# Altium footprint library PcbLib_ICs.PcbLib: 317 footprints (part 6 of 24)
Each footprint in its own frame and in the unit in brackets; x right, y up, seen from the top. Pads: shape width x height; smd on the part's side, far side on the other; paste and mask are expansions set on the pad; w line width, h text height; cw(c..) or ccw(c..) is an arc to the next point about the centre after c.
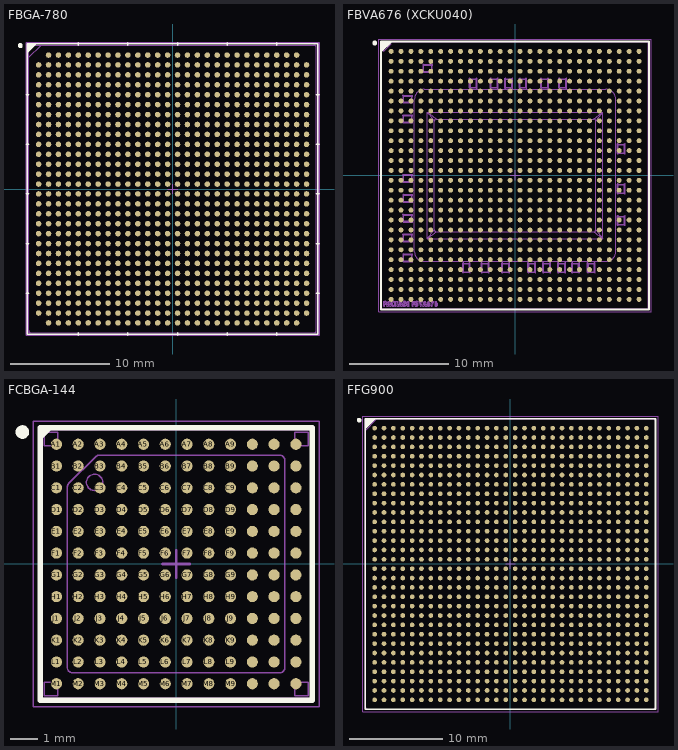
[diagram p5: the footprints below, top view; thin cyan lines are the x and y axes]

## FBGA-780 [mil] "BGA, 780-Balls, Body 29x29mm, Pitch 1mm"
pads (780):
  round 22 smd paste+0 mask+1.97: A2(-492.13,531.5) A3(-452.76,531.5) A4(-413.39,531.5) A5(-374.02,531.5) A6(-334.65,531.5) A7(-295.28,531.5) A8(-255.91,531.5) A9(-216.54,531.5) A10(-177.17,531.5) A11(-137.8,531.5) A12(-98.43,531.5) A13(-59.06,531.5) A14(-19.68,531.5) A15(19.68,531.5) A16(59.06,531.5) A17(98.43,531.5) A18(137.8,531.5) A19(177.17,531.5) A20(216.54,531.5) A21(255.91,531.5) A22(295.28,531.5) A23(334.65,531.5) A24(374.02,531.5) A25(413.39,531.5) A26(452.76,531.5) A27(492.13,531.5) AA1(-531.5,-255.91) AA2(-492.13,-255.91) AA3(-452.76,-255.91) AA4(-413.39,-255.91) AA5(-374.02,-255.91) AA6(-334.65,-255.91) AA7(-295.28,-255.91) AA8(-255.91,-255.91) AA9(-216.54,-255.91) AA10(-177.17,-255.91) AA11(-137.8,-255.91) AA12(-98.43,-255.91) AA13(-59.06,-255.91) AA14(-19.68,-255.91) AA15(19.68,-255.91) AA16(59.06,-255.91) AA17(98.43,-255.91) AA18(137.8,-255.91) AA19(177.17,-255.91) AA20(216.54,-255.91) AA21(255.91,-255.91) AA22(295.28,-255.91) AA23(334.65,-255.91) AA24(374.02,-255.91) AA25(413.39,-255.91) AA26(452.76,-255.91) AA27(492.13,-255.91) AA28(531.5,-255.91) AB1(-531.5,-295.27) AB2(-492.13,-295.27) AB3(-452.76,-295.27) AB4(-413.39,-295.27) AB5(-374.02,-295.27) AB6(-334.65,-295.27) AB7(-295.28,-295.27) AB8(-255.91,-295.27) AB9(-216.54,-295.27) AB10(-177.17,-295.27) AB11(-137.8,-295.27) AB12(-98.43,-295.27) AB13(-59.06,-295.27) AB14(-19.68,-295.27) AB15(19.68,-295.27) AB16(59.06,-295.27) AB17(98.43,-295.27) AB18(137.8,-295.27) AB19(177.17,-295.27) AB20(216.54,-295.27) AB21(255.91,-295.27) AB22(295.28,-295.27) AB23(334.65,-295.27) AB24(374.02,-295.27) AB25(413.39,-295.27) AB26(452.76,-295.27) AB27(492.13,-295.27) AB28(531.5,-295.27) AC1(-531.5,-334.64) AC2(-492.13,-334.64) AC3(-452.76,-334.64) AC4(-413.39,-334.64) AC5(-374.02,-334.64) AC6(-334.65,-334.64) AC7(-295.28,-334.64) AC8(-255.91,-334.64) AC9(-216.54,-334.64) AC10(-177.17,-334.64) AC11(-137.8,-334.64) AC12(-98.43,-334.64) AC13(-59.06,-334.64) AC14(-19.68,-334.64) AC15(19.68,-334.64) AC16(59.06,-334.64) AC17(98.43,-334.64) AC18(137.8,-334.64) AC19(177.17,-334.64) AC20(216.54,-334.64) AC21(255.91,-334.64) AC22(295.28,-334.64) AC23(334.65,-334.64) AC24(374.02,-334.64) AC25(413.39,-334.64) AC26(452.76,-334.64) AC27(492.13,-334.64) AC28(531.5,-334.64) AD1(-531.5,-374.01) AD2(-492.13,-374.01) AD3(-452.76,-374.01) AD4(-413.39,-374.01) AD5(-374.02,-374.01) AD6(-334.65,-374.01) AD7(-295.28,-374.01) AD8(-255.91,-374.01) AD9(-216.54,-374.01) AD10(-177.17,-374.01) AD11(-137.8,-374.01) AD12(-98.43,-374.01) AD13(-59.06,-374.01) AD14(-19.68,-374.01) AD15(19.68,-374.01) AD16(59.06,-374.01) AD17(98.43,-374.01) AD18(137.8,-374.01) AD19(177.17,-374.01) AD20(216.54,-374.01) AD21(255.91,-374.01) AD22(295.28,-374.01) AD23(334.65,-374.01) AD24(374.02,-374.01) AD25(413.39,-374.01) AD26(452.76,-374.01) AD27(492.13,-374.01) AD28(531.5,-374.01) AE1(-531.5,-413.38) AE2(-492.13,-413.38) AE3(-452.76,-413.38) AE4(-413.39,-413.38) AE5(-374.02,-413.38) AE6(-334.65,-413.38) AE7(-295.28,-413.38) AE8(-255.91,-413.38) AE9(-216.54,-413.38) AE10(-177.17,-413.38) AE11(-137.8,-413.38) AE12(-98.43,-413.38) AE13(-59.06,-413.38) AE14(-19.68,-413.38) AE15(19.68,-413.38) AE16(59.06,-413.38) AE17(98.43,-413.38) AE18(137.8,-413.38) AE19(177.17,-413.38) AE20(216.54,-413.38) AE21(255.91,-413.38) AE22(295.28,-413.38) AE23(334.65,-413.38) AE24(374.02,-413.38) AE25(413.39,-413.38) AE26(452.76,-413.38) AE27(492.13,-413.38) AE28(531.5,-413.38) AF1(-531.5,-452.75) AF2(-492.13,-452.75) AF3(-452.76,-452.75) AF4(-413.39,-452.75) AF5(-374.02,-452.75) AF6(-334.65,-452.75) AF7(-295.28,-452.75) AF8(-255.91,-452.75) AF9(-216.54,-452.75) AF10(-177.17,-452.75) AF11(-137.8,-452.75) AF12(-98.43,-452.75) AF13(-59.06,-452.75) AF14(-19.68,-452.75) AF15(19.68,-452.75) AF16(59.06,-452.75) AF17(98.43,-452.75) AF18(137.8,-452.75) AF19(177.17,-452.75) AF20(216.54,-452.75) AF21(255.91,-452.75) AF22(295.28,-452.75) AF23(334.65,-452.75) AF24(374.02,-452.75) AF25(413.39,-452.75) AF26(452.76,-452.75) AF27(492.13,-452.75) AF28(531.5,-452.75) AG1(-531.5,-492.12) AG2(-492.13,-492.12) AG3(-452.76,-492.12) AG4(-413.39,-492.12) AG5(-374.02,-492.12) AG6(-334.65,-492.12) AG7(-295.28,-492.12) AG8(-255.91,-492.12) AG9(-216.54,-492.12) AG10(-177.17,-492.12) AG11(-137.8,-492.12) AG12(-98.43,-492.12) AG13(-59.06,-492.12) AG14(-19.68,-492.12) AG15(19.68,-492.12) AG16(59.06,-492.12) AG17(98.43,-492.12) AG18(137.8,-492.12) AG19(177.17,-492.12) AG20(216.54,-492.12) AG21(255.91,-492.12) AG22(295.28,-492.12) AG23(334.65,-492.12) AG24(374.02,-492.12) AG25(413.39,-492.12) AG26(452.76,-492.12) AG27(492.13,-492.12) AG28(531.5,-492.12) AH2(-492.13,-531.5) AH3(-452.76,-531.5) AH4(-413.39,-531.5) AH5(-374.02,-531.5) AH6(-334.65,-531.5) AH7(-295.28,-531.5) AH8(-255.91,-531.5) AH9(-216.54,-531.5) AH10(-177.17,-531.5) AH11(-137.8,-531.5) AH12(-98.43,-531.5) AH13(-59.06,-531.5) AH14(-19.68,-531.5) AH15(19.68,-531.5) AH16(59.06,-531.5) AH17(98.43,-531.5) AH18(137.8,-531.5) AH19(177.17,-531.5) AH20(216.54,-531.5) AH21(255.91,-531.5) AH22(295.28,-531.5) AH23(334.65,-531.5) AH24(374.02,-531.5) AH25(413.39,-531.5) AH26(452.76,-531.5) AH27(492.13,-531.5) B1(-531.5,492.12) B2(-492.13,492.12) B3(-452.76,492.12) B4(-413.39,492.12) B5(-374.02,492.12) B6(-334.65,492.12) B7(-295.28,492.12) B8(-255.91,492.12) B9(-216.54,492.12) B10(-177.17,492.12) B11(-137.8,492.12) B12(-98.43,492.12) B13(-59.06,492.12) B14(-19.68,492.12) B15(19.68,492.12) B16(59.06,492.12) B17(98.43,492.12) B18(137.8,492.12) B19(177.17,492.12) B20(216.54,492.12) B21(255.91,492.12) B22(295.28,492.12) B23(334.65,492.12) B24(374.02,492.12) B25(413.39,492.12) B26(452.76,492.12) B27(492.13,492.12) B28(531.5,492.12) C1(-531.5,452.75) C2(-492.13,452.75) C3(-452.76,452.75) C4(-413.39,452.75) C5(-374.02,452.75) C6(-334.65,452.75) C7(-295.28,452.75) C8(-255.91,452.75) C9(-216.54,452.75) C10(-177.17,452.75) C11(-137.8,452.75) C12(-98.43,452.75) C13(-59.06,452.75) C14(-19.68,452.75) C15(19.68,452.75) C16(59.06,452.75) C17(98.43,452.75) C18(137.8,452.75) C19(177.17,452.75) C20(216.54,452.75) C21(255.91,452.75) C22(295.28,452.75) C23(334.65,452.75) C24(374.02,452.75) C25(413.39,452.75) C26(452.76,452.75) C27(492.13,452.75) C28(531.5,452.75) D1(-531.5,413.38) D2(-492.13,413.38) D3(-452.76,413.38) D4(-413.39,413.38) D5(-374.02,413.38) D6(-334.65,413.38) D7(-295.28,413.38) D8(-255.91,413.38) D9(-216.54,413.38) D10(-177.17,413.38) D11(-137.8,413.38) D12(-98.43,413.38) D13(-59.06,413.38) D14(-19.68,413.38) D15(19.68,413.38) D16(59.06,413.38) D17(98.43,413.38) D18(137.8,413.38) D19(177.17,413.38) D20(216.54,413.38) D21(255.91,413.38) D22(295.28,413.38) D23(334.65,413.38) D24(374.02,413.38) D25(413.39,413.38) D26(452.76,413.38) D27(492.13,413.38) D28(531.5,413.38) E1(-531.5,374.01) E2(-492.13,374.01) E3(-452.76,374.01) E4(-413.39,374.01) E5(-374.02,374.01) E6(-334.65,374.01) E7(-295.28,374.01) E8(-255.91,374.01) E9(-216.54,374.01) E10(-177.17,374.01) E11(-137.8,374.01) E12(-98.43,374.01) E13(-59.06,374.01) E14(-19.68,374.01) E15(19.68,374.01) E16(59.06,374.01) E17(98.43,374.01) E18(137.8,374.01) E19(177.17,374.01) E20(216.54,374.01) E21(255.91,374.01) E22(295.28,374.01) E23(334.65,374.01) E24(374.02,374.01) E25(413.39,374.01) E26(452.76,374.01) E27(492.13,374.01) E28(531.5,374.01) F1(-531.5,334.64) F2(-492.13,334.64) F3(-452.76,334.64) F4(-413.39,334.64) F5(-374.02,334.64) F6(-334.65,334.64) F7(-295.28,334.64) F8(-255.91,334.64) F9(-216.54,334.64) F10(-177.17,334.64) F11(-137.8,334.64) F12(-98.43,334.64) F13(-59.06,334.64) F14(-19.68,334.64) F15(19.68,334.64) F16(59.06,334.64) F17(98.43,334.64) F18(137.8,334.64) F19(177.17,334.64) F20(216.54,334.64) F21(255.91,334.64) F22(295.28,334.64) F23(334.65,334.64) F24(374.02,334.64) F25(413.39,334.64) F26(452.76,334.64) F27(492.13,334.64) F28(531.5,334.64) G1(-531.5,295.27) G2(-492.13,295.27) G3(-452.76,295.27) G4(-413.39,295.27) G5(-374.02,295.27) G6(-334.65,295.27) G7(-295.28,295.27) G8(-255.91,295.27) G9(-216.54,295.27) G10(-177.17,295.27) G11(-137.8,295.27) G12(-98.43,295.27) G13(-59.06,295.27) G14(-19.68,295.27) G15(19.68,295.27) G16(59.06,295.27) G17(98.43,295.27) G18(137.8,295.27) G19(177.17,295.27) G20(216.54,295.27) G21(255.91,295.27) G22(295.28,295.27) G23(334.65,295.27) G24(374.02,295.27) G25(413.39,295.27) G26(452.76,295.27) G27(492.13,295.27) G28(531.5,295.27) H1(-531.5,255.91) H2(-492.13,255.91) H3(-452.76,255.91) H4(-413.39,255.91) H5(-374.02,255.91) H6(-334.65,255.91) H7(-295.28,255.91) H8(-255.91,255.91) H9(-216.54,255.91) H10(-177.17,255.91) H11(-137.8,255.91) H12(-98.43,255.91) H13(-59.06,255.91) H14(-19.68,255.91) H15(19.68,255.91) H16(59.06,255.91) H17(98.43,255.91) H18(137.8,255.91) H19(177.17,255.91) H20(216.54,255.91) H21(255.91,255.91) H22(295.28,255.91) H23(334.65,255.91) H24(374.02,255.91) H25(413.39,255.91) H26(452.76,255.91) H27(492.13,255.91) H28(531.5,255.91) J1(-531.5,216.53) J2(-492.13,216.53) J3(-452.76,216.53) J4(-413.39,216.53) J5(-374.02,216.53) J6(-334.65,216.53) J7(-295.28,216.53) J8(-255.91,216.53) J9(-216.54,216.53) J10(-177.17,216.53) J11(-137.8,216.53) J12(-98.43,216.53) J13(-59.06,216.53) J14(-19.68,216.53) J15(19.68,216.53) J16(59.06,216.53) J17(98.43,216.53) J18(137.8,216.53) J19(177.17,216.53) J20(216.54,216.53) J21(255.91,216.53) J22(295.28,216.53) J23(334.65,216.53) J24(374.02,216.53) J25(413.39,216.53) J26(452.76,216.53) J27(492.13,216.53) J28(531.5,216.53) K1(-531.5,177.16) K2(-492.13,177.16) K3(-452.76,177.16) K4(-413.39,177.16) K5(-374.02,177.16) K6(-334.65,177.16) K7(-295.28,177.16) K8(-255.91,177.16) K9(-216.54,177.16) K10(-177.17,177.16) K11(-137.8,177.16) K12(-98.43,177.16) K13(-59.06,177.16) K14(-19.68,177.16) K15(19.68,177.16) K16(59.06,177.16) K17(98.43,177.16) K18(137.8,177.16) K19(177.17,177.16) K20(216.54,177.16) K21(255.91,177.16) K22(295.28,177.16) K23(334.65,177.16) K24(374.02,177.16) K25(413.39,177.16) K26(452.76,177.16) K27(492.13,177.16) K28(531.5,177.16) L1(-531.5,137.79) L2(-492.13,137.79) L3(-452.76,137.79) L4(-413.39,137.79) L5(-374.02,137.79) L6(-334.65,137.79) L7(-295.28,137.79) L8(-255.91,137.79) L9(-216.54,137.79) L10(-177.17,137.79) L11(-137.8,137.79) L12(-98.43,137.79) L13(-59.06,137.79) L14(-19.68,137.79) L15(19.68,137.79) L16(59.06,137.79) L17(98.43,137.79) L18(137.8,137.79) L19(177.17,137.79) L20(216.54,137.79) L21(255.91,137.79) L22(295.28,137.79) L23(334.65,137.79) L24(374.02,137.79) L25(413.39,137.79) L26(452.76,137.79) L27(492.13,137.79) L28(531.5,137.79) M1(-531.5,98.42) M2(-492.13,98.42) M3(-452.76,98.42) M4(-413.39,98.42) M5(-374.02,98.42) M6(-334.65,98.42) M7(-295.28,98.42) M8(-255.91,98.42) M9(-216.54,98.42) M10(-177.17,98.42) M11(-137.8,98.42) M12(-98.43,98.42) M13(-59.06,98.42) M14(-19.68,98.42) M15(19.68,98.42) M16(59.06,98.42) M17(98.43,98.42) M18(137.8,98.42) M19(177.17,98.42) M20(216.54,98.42) M21(255.91,98.42) M22(295.28,98.42) M23(334.65,98.42) M24(374.02,98.42) M25(413.39,98.42) M26(452.76,98.42) M27(492.13,98.42) M28(531.5,98.42) N1(-531.5,59.05) N2(-492.13,59.05) N3(-452.76,59.05) N4(-413.39,59.05) N5(-374.02,59.05) N6(-334.65,59.05) N7(-295.28,59.05) N8(-255.91,59.05) N9(-216.54,59.05) N10(-177.17,59.05) N11(-137.8,59.05) N12(-98.43,59.05) N13(-59.06,59.05) N14(-19.68,59.05) N15(19.68,59.05) N16(59.06,59.05) N17(98.43,59.05) N18(137.8,59.05) N19(177.17,59.05) N20(216.54,59.05) N21(255.91,59.05) N22(295.28,59.05) N23(334.65,59.05) N24(374.02,59.05) N25(413.39,59.05) N26(452.76,59.05) N27(492.13,59.05) N28(531.5,59.05) P1(-531.5,19.68) P2(-492.13,19.68) P3(-452.76,19.68) P4(-413.39,19.68) P5(-374.02,19.68) P6(-334.65,19.68) P7(-295.28,19.68) P8(-255.91,19.68) P9(-216.54,19.68) P10(-177.17,19.68) P11(-137.8,19.68) P12(-98.43,19.68) P13(-59.06,19.68) P14(-19.68,19.68) P15(19.68,19.68) P16(59.06,19.68) P17(98.43,19.68) P18(137.8,19.68) P19(177.17,19.68) P20(216.54,19.68) P21(255.91,19.68) P22(295.28,19.68) P23(334.65,19.68) P24(374.02,19.68) P25(413.39,19.68) P26(452.76,19.68) P27(492.13,19.68) P28(531.5,19.68) R1(-531.5,-19.68) R2(-492.13,-19.68) R3(-452.76,-19.68) R4(-413.39,-19.68) R5(-374.02,-19.68) R6(-334.65,-19.68) R7(-295.28,-19.68) R8(-255.91,-19.68) R9(-216.54,-19.68) R10(-177.17,-19.68) R11(-137.8,-19.68) R12(-98.43,-19.68) R13(-59.06,-19.68) R14(-19.68,-19.68) R15(19.68,-19.68) R16(59.06,-19.68) R17(98.43,-19.68) R18(137.8,-19.68) R19(177.17,-19.68) R20(216.54,-19.68) R21(255.91,-19.68) R22(295.28,-19.68) R23(334.65,-19.68) R24(374.02,-19.68) R25(413.39,-19.68) R26(452.76,-19.68) R27(492.13,-19.68) R28(531.5,-19.68) T1(-531.5,-59.05) T2(-492.13,-59.05) T3(-452.76,-59.05) T4(-413.39,-59.05) T5(-374.02,-59.05) T6(-334.65,-59.05) T7(-295.28,-59.05) T8(-255.91,-59.05) T9(-216.54,-59.05) T10(-177.17,-59.05) T11(-137.8,-59.05) T12(-98.43,-59.05) T13(-59.06,-59.05) T14(-19.68,-59.05) T15(19.68,-59.05) T16(59.06,-59.05) T17(98.43,-59.05) T18(137.8,-59.05) T19(177.17,-59.05) T20(216.54,-59.05) T21(255.91,-59.05) T22(295.28,-59.05) T23(334.65,-59.05) T24(374.02,-59.05) T25(413.39,-59.05) T26(452.76,-59.05) T27(492.13,-59.05) T28(531.5,-59.05) U1(-531.5,-98.42) U2(-492.13,-98.42) U3(-452.76,-98.42) U4(-413.39,-98.42) U5(-374.02,-98.42) U6(-334.65,-98.42) U7(-295.28,-98.42) U8(-255.91,-98.42) U9(-216.54,-98.42) U10(-177.17,-98.42) U11(-137.8,-98.42) U12(-98.43,-98.42) U13(-59.06,-98.42) U14(-19.68,-98.42) U15(19.68,-98.42) U16(59.06,-98.42) U17(98.43,-98.42) U18(137.8,-98.42) U19(177.17,-98.42) U20(216.54,-98.42) U21(255.91,-98.42) U22(295.28,-98.42) U23(334.65,-98.42) U24(374.02,-98.42) U25(413.39,-98.42) U26(452.76,-98.42) U27(492.13,-98.42) U28(531.5,-98.42) V1(-531.5,-137.79) V2(-492.13,-137.79) V3(-452.76,-137.79) V4(-413.39,-137.79) V5(-374.02,-137.79) V6(-334.65,-137.79) V7(-295.28,-137.79) V8(-255.91,-137.79) V9(-216.54,-137.79) V10(-177.17,-137.79) V11(-137.8,-137.79) V12(-98.43,-137.79) V13(-59.06,-137.79) V14(-19.68,-137.79) V15(19.68,-137.79) V16(59.06,-137.79) V17(98.43,-137.79) V18(137.8,-137.79) V19(177.17,-137.79) V20(216.54,-137.79) V21(255.91,-137.79) V22(295.28,-137.79) V23(334.65,-137.79) V24(374.02,-137.79) V25(413.39,-137.79) V26(452.76,-137.79) V27(492.13,-137.79) V28(531.5,-137.79) W1(-531.5,-177.16) W2(-492.13,-177.16) W3(-452.76,-177.16) W4(-413.39,-177.16) W5(-374.02,-177.16) W6(-334.65,-177.16) W7(-295.28,-177.16) W8(-255.91,-177.16) W9(-216.54,-177.16) W10(-177.17,-177.16) W11(-137.8,-177.16) W12(-98.43,-177.16) W13(-59.06,-177.16) W14(-19.68,-177.16) W15(19.68,-177.16) W16(59.06,-177.16) W17(98.43,-177.16) W18(137.8,-177.16) W19(177.17,-177.16) W20(216.54,-177.16) W21(255.91,-177.16) W22(295.28,-177.16) W23(334.65,-177.16) W24(374.02,-177.16) W25(413.39,-177.16) W26(452.76,-177.16) W27(492.13,-177.16) W28(531.5,-177.16) Y1(-531.5,-216.53) Y2(-492.13,-216.53) Y3(-452.76,-216.53) Y4(-413.39,-216.53) Y5(-374.02,-216.53) Y6(-334.65,-216.53) Y7(-295.28,-216.53) Y8(-255.91,-216.53) Y9(-216.54,-216.53) Y10(-177.17,-216.53) Y11(-137.8,-216.53) Y12(-98.43,-216.53) Y13(-59.06,-216.53) Y14(-19.68,-216.53) Y15(19.68,-216.53) Y16(59.06,-216.53) Y17(98.43,-216.53) Y18(137.8,-216.53) Y19(177.17,-216.53) Y20(216.54,-216.53) Y21(255.91,-216.53) Y22(295.28,-216.53) Y23(334.65,-216.53) Y24(374.02,-216.53) Y25(413.39,-216.53) Y26(452.76,-216.53) Y27(492.13,-216.53) Y28(531.5,-216.53)
Top Overlay:
  circle w9.84: c-604.33,568.9 r4.92
  region: -576,576 -538.39,576 -576,538.39
  lines w6: -581,-413.38 -571,-413.38 ; -581,-216.53 -571,-216.53 ; -581,-19.68 -571,-19.68 ; -581,177.17 -571,177.17 ; -581,374.01 -571,374.01 ; -374.02,-581 -374.02,-571 ; -374.02,571 -374.02,581 ; -177.17,-581 -177.17,-571 ; -177.17,571 -177.17,581 ; 19.69,-581 19.69,-571 ; 19.69,571 19.69,581 ; 216.54,-581 216.54,-571 ; 216.54,571 216.54,581 ; 413.39,-581 413.39,-571 ; 413.39,571 413.39,581 ; 571,-413.38 581,-413.38 ; 571,-216.53 581,-216.53 ; 571,-19.68 581,-19.68 ; 571,177.17 581,177.17 ; 571,374.01 581,374.01 ; -576,-576 576,-576 576,576 -576,576 -576,-576
Top Assy:
  lines w1.97: -571,521.79 -521.79,571 ; -570.87,-561.02 ccw(c-561.02,-561.02) -561.02,-570.87 ; 561.02,-570.87 ccw(c561.02,-561.02) 570.87,-561.02 ; 561.02,570.87 cw(c561.02,561.02) 570.87,561.02 ; -571,-571 571,-571 571,571 -571,571 -571,-571
  text ".Designator" at -135.56,-18.37 h78.74
Top Text:
  lines w3.94: -19.69,0 19.68,0 ; 0,-19.68 0,19.68
  lines w6: -581,-581 -581,581 581,581 581,-581 -581,-581
3D body "FBGA780.STEP": height 134.3, standoff -3.54, extent -570.87,-570.87 570.86,570.87

## FBVA676 (XCKU040) [mm] "BGA, 676-Leads, Body 27.00x27.00mmx2.54mm, Pitch 1.00mm"
height 2.54
pads (676):
  round 0.5 smd paste+0 mask+0.075: A1(-12.5,12.5) A2(-11.5,12.5) A3(-10.5,12.5) A4(-9.5,12.5) A5(-8.5,12.5) A6(-7.5,12.5) A7(-6.5,12.5) A8(-5.5,12.5) A9(-4.5,12.5) A10(-3.5,12.5) A11(-2.5,12.5) A12(-1.5,12.5) A13(-0.5,12.5) A14(0.5,12.5) A15(1.5,12.5) A16(2.5,12.5) A17(3.5,12.5) A18(4.5,12.5) A19(5.5,12.5) A20(6.5,12.5) A21(7.5,12.5) A22(8.5,12.5) A23(9.5,12.5) A24(10.5,12.5) A25(11.5,12.5) A26(12.5,12.5) AA1(-12.5,-7.5) AA2(-11.5,-7.5) AA3(-10.5,-7.5) AA4(-9.5,-7.5) AA5(-8.5,-7.5) AA6(-7.5,-7.5) AA7(-6.5,-7.5) AA8(-5.5,-7.5) AA9(-4.5,-7.5) AA10(-3.5,-7.5) AA11(-2.5,-7.5) AA12(-1.5,-7.5) AA13(-0.5,-7.5) AA14(0.5,-7.5) AA15(1.5,-7.5) AA16(2.5,-7.5) AA17(3.5,-7.5) AA18(4.5,-7.5) AA19(5.5,-7.5) AA20(6.5,-7.5) AA21(7.5,-7.5) AA22(8.5,-7.5) AA23(9.5,-7.5) AA24(10.5,-7.5) AA25(11.5,-7.5) AA26(12.5,-7.5) AB1(-12.5,-8.5) AB2(-11.5,-8.5) AB3(-10.5,-8.5) AB4(-9.5,-8.5) AB5(-8.5,-8.5) AB6(-7.5,-8.5) AB7(-6.5,-8.5) AB8(-5.5,-8.5) AB9(-4.5,-8.5) AB10(-3.5,-8.5) AB11(-2.5,-8.5) AB12(-1.5,-8.5) AB13(-0.5,-8.5) AB14(0.5,-8.5) AB15(1.5,-8.5) AB16(2.5,-8.5) AB17(3.5,-8.5) AB18(4.5,-8.5) AB19(5.5,-8.5) AB20(6.5,-8.5) AB21(7.5,-8.5) AB22(8.5,-8.5) AB23(9.5,-8.5) AB24(10.5,-8.5) AB25(11.5,-8.5) AB26(12.5,-8.5) AC1(-12.5,-9.5) AC2(-11.5,-9.5) AC3(-10.5,-9.5) AC4(-9.5,-9.5) AC5(-8.5,-9.5) AC6(-7.5,-9.5) AC7(-6.5,-9.5) AC8(-5.5,-9.5) AC9(-4.5,-9.5) AC10(-3.5,-9.5) AC11(-2.5,-9.5) AC12(-1.5,-9.5) AC13(-0.5,-9.5) AC14(0.5,-9.5) AC15(1.5,-9.5) AC16(2.5,-9.5) AC17(3.5,-9.5) AC18(4.5,-9.5) AC19(5.5,-9.5) AC20(6.5,-9.5) AC21(7.5,-9.5) AC22(8.5,-9.5) AC23(9.5,-9.5) AC24(10.5,-9.5) AC25(11.5,-9.5) AC26(12.5,-9.5) AD1(-12.5,-10.5) AD2(-11.5,-10.5) AD3(-10.5,-10.5) AD4(-9.5,-10.5) AD5(-8.5,-10.5) AD6(-7.5,-10.5) AD7(-6.5,-10.5) AD8(-5.5,-10.5) AD9(-4.5,-10.5) AD10(-3.5,-10.5) AD11(-2.5,-10.5) AD12(-1.5,-10.5) AD13(-0.5,-10.5) AD14(0.5,-10.5) AD15(1.5,-10.5) AD16(2.5,-10.5) AD17(3.5,-10.5) AD18(4.5,-10.5) AD19(5.5,-10.5) AD20(6.5,-10.5) AD21(7.5,-10.5) AD22(8.5,-10.5) AD23(9.5,-10.5) AD24(10.5,-10.5) AD25(11.5,-10.5) AD26(12.5,-10.5) AE1(-12.5,-11.5) AE2(-11.5,-11.5) AE3(-10.5,-11.5) AE4(-9.5,-11.5) AE5(-8.5,-11.5) AE6(-7.5,-11.5) AE7(-6.5,-11.5) AE8(-5.5,-11.5) AE9(-4.5,-11.5) AE10(-3.5,-11.5) AE11(-2.5,-11.5) AE12(-1.5,-11.5) AE13(-0.5,-11.5) AE14(0.5,-11.5) AE15(1.5,-11.5) AE16(2.5,-11.5) AE17(3.5,-11.5) AE18(4.5,-11.5) AE19(5.5,-11.5) AE20(6.5,-11.5) AE21(7.5,-11.5) AE22(8.5,-11.5) AE23(9.5,-11.5) AE24(10.5,-11.5) AE25(11.5,-11.5) AE26(12.5,-11.5) AF1(-12.5,-12.5) AF2(-11.5,-12.5) AF3(-10.5,-12.5) AF4(-9.5,-12.5) AF5(-8.5,-12.5) AF6(-7.5,-12.5) AF7(-6.5,-12.5) AF8(-5.5,-12.5) AF9(-4.5,-12.5) AF10(-3.5,-12.5) AF11(-2.5,-12.5) AF12(-1.5,-12.5) AF13(-0.5,-12.5) AF14(0.5,-12.5) AF15(1.5,-12.5) AF16(2.5,-12.5) AF17(3.5,-12.5) AF18(4.5,-12.5) AF19(5.5,-12.5) AF20(6.5,-12.5) AF21(7.5,-12.5) AF22(8.5,-12.5) AF23(9.5,-12.5) AF24(10.5,-12.5) AF25(11.5,-12.5) AF26(12.5,-12.5) B1(-12.5,11.5) B2(-11.5,11.5) B3(-10.5,11.5) B4(-9.5,11.5) B5(-8.5,11.5) B6(-7.5,11.5) B7(-6.5,11.5) B8(-5.5,11.5) B9(-4.5,11.5) B10(-3.5,11.5) B11(-2.5,11.5) B12(-1.5,11.5) B13(-0.5,11.5) B14(0.5,11.5) B15(1.5,11.5) B16(2.5,11.5) B17(3.5,11.5) B18(4.5,11.5) B19(5.5,11.5) B20(6.5,11.5) B21(7.5,11.5) B22(8.5,11.5) B23(9.5,11.5) B24(10.5,11.5) B25(11.5,11.5) B26(12.5,11.5) C1(-12.5,10.5) C2(-11.5,10.5) C3(-10.5,10.5) C4(-9.5,10.5) C5(-8.5,10.5) C6(-7.5,10.5) C7(-6.5,10.5) C8(-5.5,10.5) C9(-4.5,10.5) C10(-3.5,10.5) C11(-2.5,10.5) C12(-1.5,10.5) C13(-0.5,10.5) C14(0.5,10.5) C15(1.5,10.5) C16(2.5,10.5) C17(3.5,10.5) C18(4.5,10.5) C19(5.5,10.5) C20(6.5,10.5) C21(7.5,10.5) C22(8.5,10.5) C23(9.5,10.5) C24(10.5,10.5) C25(11.5,10.5) C26(12.5,10.5) D1(-12.5,9.5) D2(-11.5,9.5) D3(-10.5,9.5) D4(-9.5,9.5) D5(-8.5,9.5) D6(-7.5,9.5) D7(-6.5,9.5) D8(-5.5,9.5) D9(-4.5,9.5) D10(-3.5,9.5) D11(-2.5,9.5) D12(-1.5,9.5) D13(-0.5,9.5) D14(0.5,9.5) D15(1.5,9.5) D16(2.5,9.5) D17(3.5,9.5) D18(4.5,9.5) D19(5.5,9.5) D20(6.5,9.5) D21(7.5,9.5) D22(8.5,9.5) D23(9.5,9.5) D24(10.5,9.5) D25(11.5,9.5) D26(12.5,9.5) E1(-12.5,8.5) E2(-11.5,8.5) E3(-10.5,8.5) E4(-9.5,8.5) E5(-8.5,8.5) E6(-7.5,8.5) E7(-6.5,8.5) E8(-5.5,8.5) E9(-4.5,8.5) E10(-3.5,8.5) E11(-2.5,8.5) E12(-1.5,8.5) E13(-0.5,8.5) E14(0.5,8.5) E15(1.5,8.5) E16(2.5,8.5) E17(3.5,8.5) E18(4.5,8.5) E19(5.5,8.5) E20(6.5,8.5) E21(7.5,8.5) E22(8.5,8.5) E23(9.5,8.5) E24(10.5,8.5) E25(11.5,8.5) E26(12.5,8.5) F1(-12.5,7.5) F2(-11.5,7.5) F3(-10.5,7.5) F4(-9.5,7.5) F5(-8.5,7.5) F6(-7.5,7.5) F7(-6.5,7.5) F8(-5.5,7.5) F9(-4.5,7.5) F10(-3.5,7.5) F11(-2.5,7.5) F12(-1.5,7.5) F13(-0.5,7.5) F14(0.5,7.5) F15(1.5,7.5) F16(2.5,7.5) F17(3.5,7.5) F18(4.5,7.5) F19(5.5,7.5) F20(6.5,7.5) F21(7.5,7.5) F22(8.5,7.5) F23(9.5,7.5) F24(10.5,7.5) F25(11.5,7.5) F26(12.5,7.5) G1(-12.5,6.5) G2(-11.5,6.5) G3(-10.5,6.5) G4(-9.5,6.5) G5(-8.5,6.5) G6(-7.5,6.5) G7(-6.5,6.5) G8(-5.5,6.5) G9(-4.5,6.5) G10(-3.5,6.5) G11(-2.5,6.5) G12(-1.5,6.5) G13(-0.5,6.5) G14(0.5,6.5) G15(1.5,6.5) G16(2.5,6.5) G17(3.5,6.5) G18(4.5,6.5) G19(5.5,6.5) G20(6.5,6.5) G21(7.5,6.5) G22(8.5,6.5) G23(9.5,6.5) G24(10.5,6.5) G25(11.5,6.5) G26(12.5,6.5) H1(-12.5,5.5) H2(-11.5,5.5) H3(-10.5,5.5) H4(-9.5,5.5) H5(-8.5,5.5) H6(-7.5,5.5) H7(-6.5,5.5) H8(-5.5,5.5) H9(-4.5,5.5) H10(-3.5,5.5) H11(-2.5,5.5) H12(-1.5,5.5) H13(-0.5,5.5) H14(0.5,5.5) H15(1.5,5.5) H16(2.5,5.5) H17(3.5,5.5) H18(4.5,5.5) H19(5.5,5.5) H20(6.5,5.5) H21(7.5,5.5) H22(8.5,5.5) H23(9.5,5.5) H24(10.5,5.5) H25(11.5,5.5) H26(12.5,5.5) J1(-12.5,4.5) J2(-11.5,4.5) J3(-10.5,4.5) J4(-9.5,4.5) J5(-8.5,4.5) J6(-7.5,4.5) J7(-6.5,4.5) J8(-5.5,4.5) J9(-4.5,4.5) J10(-3.5,4.5) J11(-2.5,4.5) J12(-1.5,4.5) J13(-0.5,4.5) J14(0.5,4.5) J15(1.5,4.5) J16(2.5,4.5) J17(3.5,4.5) J18(4.5,4.5) J19(5.5,4.5) J20(6.5,4.5) J21(7.5,4.5) J22(8.5,4.5) J23(9.5,4.5) J24(10.5,4.5) J25(11.5,4.5) J26(12.5,4.5) K1(-12.5,3.5) K2(-11.5,3.5) K3(-10.5,3.5) K4(-9.5,3.5) K5(-8.5,3.5) K6(-7.5,3.5) K7(-6.5,3.5) K8(-5.5,3.5) K9(-4.5,3.5) K10(-3.5,3.5) K11(-2.5,3.5) K12(-1.5,3.5) K13(-0.5,3.5) K14(0.5,3.5) K15(1.5,3.5) K16(2.5,3.5) K17(3.5,3.5) K18(4.5,3.5) K19(5.5,3.5) K20(6.5,3.5) K21(7.5,3.5) K22(8.5,3.5) K23(9.5,3.5) K24(10.5,3.5) K25(11.5,3.5) K26(12.5,3.5) L1(-12.5,2.5) L2(-11.5,2.5) L3(-10.5,2.5) L4(-9.5,2.5) L5(-8.5,2.5) L6(-7.5,2.5) L7(-6.5,2.5) L8(-5.5,2.5) L9(-4.5,2.5) L10(-3.5,2.5) L11(-2.5,2.5) L12(-1.5,2.5) L13(-0.5,2.5) L14(0.5,2.5) L15(1.5,2.5) L16(2.5,2.5) L17(3.5,2.5) L18(4.5,2.5) L19(5.5,2.5) L20(6.5,2.5) L21(7.5,2.5) L22(8.5,2.5) L23(9.5,2.5) L24(10.5,2.5) L25(11.5,2.5) L26(12.5,2.5) M1(-12.5,1.5) M2(-11.5,1.5) M3(-10.5,1.5) M4(-9.5,1.5) M5(-8.5,1.5) M6(-7.5,1.5) M7(-6.5,1.5) M8(-5.5,1.5) M9(-4.5,1.5) M10(-3.5,1.5) M11(-2.5,1.5) M12(-1.5,1.5) M13(-0.5,1.5) M14(0.5,1.5) M15(1.5,1.5) M16(2.5,1.5) M17(3.5,1.5) M18(4.5,1.5) M19(5.5,1.5) M20(6.5,1.5) M21(7.5,1.5) M22(8.5,1.5) M23(9.5,1.5) M24(10.5,1.5) M25(11.5,1.5) M26(12.5,1.5) N1(-12.5,0.5) N2(-11.5,0.5) N3(-10.5,0.5) N4(-9.5,0.5) N5(-8.5,0.5) N6(-7.5,0.5) N7(-6.5,0.5) N8(-5.5,0.5) N9(-4.5,0.5) N10(-3.5,0.5) N11(-2.5,0.5) N12(-1.5,0.5) N13(-0.5,0.5) N14(0.5,0.5) N15(1.5,0.5) N16(2.5,0.5) N17(3.5,0.5) N18(4.5,0.5) N19(5.5,0.5) N20(6.5,0.5) N21(7.5,0.5) N22(8.5,0.5) N23(9.5,0.5) N24(10.5,0.5) N25(11.5,0.5) N26(12.5,0.5) P1(-12.5,-0.5) P2(-11.5,-0.5) P3(-10.5,-0.5) P4(-9.5,-0.5) P5(-8.5,-0.5) P6(-7.5,-0.5) P7(-6.5,-0.5) P8(-5.5,-0.5) P9(-4.5,-0.5) P10(-3.5,-0.5) P11(-2.5,-0.5) P12(-1.5,-0.5) P13(-0.5,-0.5) P14(0.5,-0.5) P15(1.5,-0.5) P16(2.5,-0.5) P17(3.5,-0.5) P18(4.5,-0.5) P19(5.5,-0.5) P20(6.5,-0.5) P21(7.5,-0.5) P22(8.5,-0.5) P23(9.5,-0.5) P24(10.5,-0.5) P25(11.5,-0.5) P26(12.5,-0.5) R1(-12.5,-1.5) R2(-11.5,-1.5) R3(-10.5,-1.5) R4(-9.5,-1.5) R5(-8.5,-1.5) R6(-7.5,-1.5) R7(-6.5,-1.5) R8(-5.5,-1.5) R9(-4.5,-1.5) R10(-3.5,-1.5) R11(-2.5,-1.5) R12(-1.5,-1.5) R13(-0.5,-1.5) R14(0.5,-1.5) R15(1.5,-1.5) R16(2.5,-1.5) R17(3.5,-1.5) R18(4.5,-1.5) R19(5.5,-1.5) R20(6.5,-1.5) R21(7.5,-1.5) R22(8.5,-1.5) R23(9.5,-1.5) R24(10.5,-1.5) R25(11.5,-1.5) R26(12.5,-1.5) T1(-12.5,-2.5) T2(-11.5,-2.5) T3(-10.5,-2.5) T4(-9.5,-2.5) T5(-8.5,-2.5) T6(-7.5,-2.5) T7(-6.5,-2.5) T8(-5.5,-2.5) T9(-4.5,-2.5) T10(-3.5,-2.5) T11(-2.5,-2.5) T12(-1.5,-2.5) T13(-0.5,-2.5) T14(0.5,-2.5) T15(1.5,-2.5) T16(2.5,-2.5) T17(3.5,-2.5) T18(4.5,-2.5) T19(5.5,-2.5) T20(6.5,-2.5) T21(7.5,-2.5) T22(8.5,-2.5) T23(9.5,-2.5) T24(10.5,-2.5) T25(11.5,-2.5) T26(12.5,-2.5) U1(-12.5,-3.5) U2(-11.5,-3.5) U3(-10.5,-3.5) U4(-9.5,-3.5) U5(-8.5,-3.5) U6(-7.5,-3.5) U7(-6.5,-3.5) U8(-5.5,-3.5) U9(-4.5,-3.5) U10(-3.5,-3.5) U11(-2.5,-3.5) U12(-1.5,-3.5) U13(-0.5,-3.5) U14(0.5,-3.5) U15(1.5,-3.5) U16(2.5,-3.5) U17(3.5,-3.5) U18(4.5,-3.5) U19(5.5,-3.5) U20(6.5,-3.5) U21(7.5,-3.5) U22(8.5,-3.5) U23(9.5,-3.5) U24(10.5,-3.5) U25(11.5,-3.5) U26(12.5,-3.5) V1(-12.5,-4.5) V2(-11.5,-4.5) V3(-10.5,-4.5) V4(-9.5,-4.5) V5(-8.5,-4.5) V6(-7.5,-4.5) V7(-6.5,-4.5) V8(-5.5,-4.5) V9(-4.5,-4.5) V10(-3.5,-4.5) V11(-2.5,-4.5) V12(-1.5,-4.5) V13(-0.5,-4.5) V14(0.5,-4.5) V15(1.5,-4.5) V16(2.5,-4.5) V17(3.5,-4.5) V18(4.5,-4.5) V19(5.5,-4.5) V20(6.5,-4.5) V21(7.5,-4.5) V22(8.5,-4.5) V23(9.5,-4.5) V24(10.5,-4.5) V25(11.5,-4.5) V26(12.5,-4.5) W1(-12.5,-5.5) W2(-11.5,-5.5) W3(-10.5,-5.5) W4(-9.5,-5.5) W5(-8.5,-5.5) W6(-7.5,-5.5) W7(-6.5,-5.5) W8(-5.5,-5.5) W9(-4.5,-5.5) W10(-3.5,-5.5) W11(-2.5,-5.5) W12(-1.5,-5.5) W13(-0.5,-5.5) W14(0.5,-5.5) W15(1.5,-5.5) W16(2.5,-5.5) W17(3.5,-5.5) W18(4.5,-5.5) W19(5.5,-5.5) W20(6.5,-5.5) W21(7.5,-5.5) W22(8.5,-5.5) W23(9.5,-5.5) W24(10.5,-5.5) W25(11.5,-5.5) W26(12.5,-5.5) Y1(-12.5,-6.5) Y2(-11.5,-6.5) Y3(-10.5,-6.5) Y4(-9.5,-6.5) Y5(-8.5,-6.5) Y6(-7.5,-6.5) Y7(-6.5,-6.5) Y8(-5.5,-6.5) Y9(-4.5,-6.5) Y10(-3.5,-6.5) Y11(-2.5,-6.5) Y12(-1.5,-6.5) Y13(-0.5,-6.5) Y14(0.5,-6.5) Y15(1.5,-6.5) Y16(2.5,-6.5) Y17(3.5,-6.5) Y18(4.5,-6.5) Y19(5.5,-6.5) Y20(6.5,-6.5) Y21(7.5,-6.5) Y22(8.5,-6.5) Y23(9.5,-6.5) Y24(10.5,-6.5) Y25(11.5,-6.5) Y26(12.5,-6.5)